# Altium footprint library IC.Pcblib: 91 footprints (part 1 of 6)
Each footprint in its own frame and in the unit in brackets; x right, y up, seen from the top. Pads: shape width x height; smd on the part's side, far side on the other; paste and mask are expansions set on the pad; w line width, h text height; cw(c..) or ccw(c..) is an arc to the next point about the centre after c.
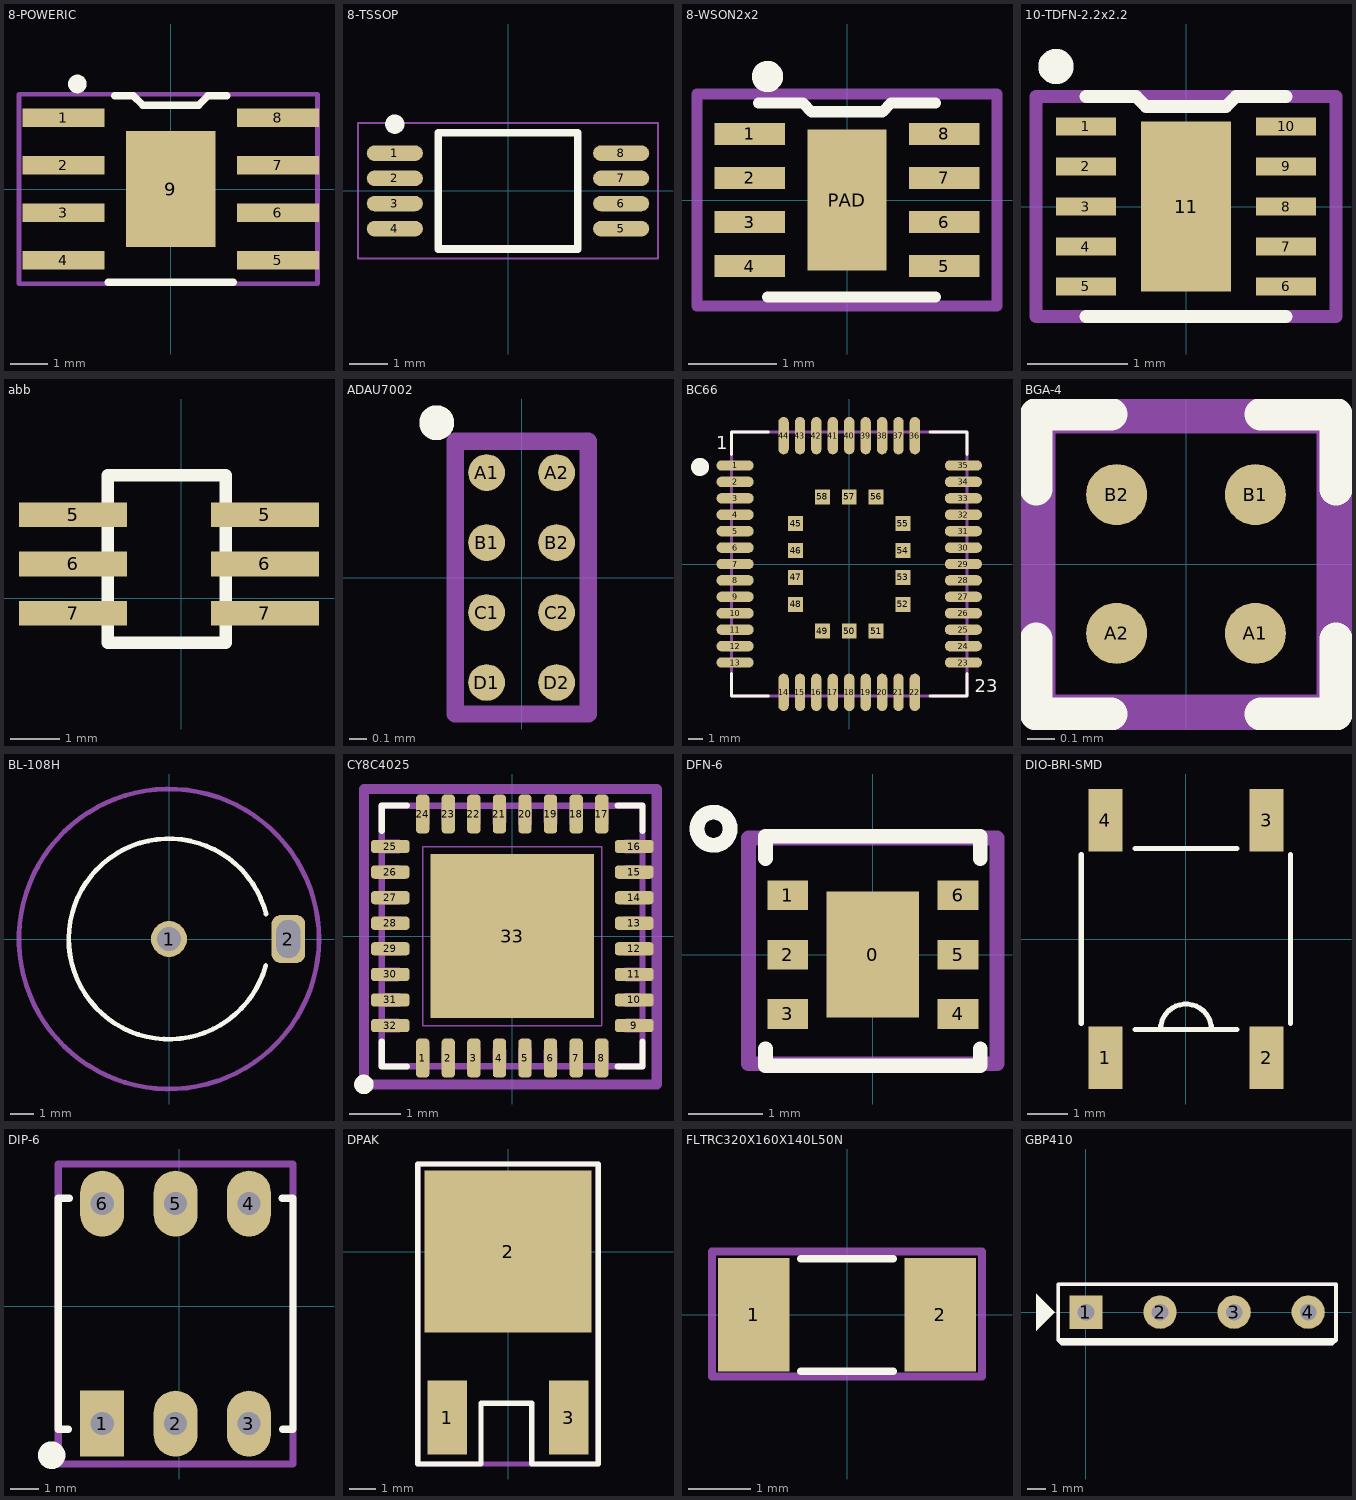
[diagram p0: the footprints below, top view; thin cyan lines are the x and y axes]

## 8-POWERIC [mm] "8-PowerSOIC (0.154\", 3.90mm Width)"
height 1.44
pads (9):
  rect 2.2x0.5 smd: 1(-2.875,1.905) 2(-2.875,0.635) 3(-2.875,-0.635) 4(-2.875,-1.905) 5(2.875,-1.905) 6(2.875,-0.635) 7(2.875,0.635) 8(2.875,1.905)
  rect 2.4x3.1 smd: 9(0,0)
Top Overlay:
  circle w0.25: c-2.5,2.815 r0.125
  lines w0.2: -1.675,-2.5 1.675,-2.5 ; -1.5,2.5 -1,2.5 -0.75,2.25 0.75,2.25 1,2.5 1.5,2.5
Mechanical 13:
  lines w0.127: -4.064,-2.54 3.937,-2.54 3.937,2.54 -4.064,2.54 -4.064,-2.54
  text ".Designator" at -0.127,2.286 h1
Mechanical 15:
  lines w0.127: -4.064,-2.54 -4.064,2.54 3.937,2.54 3.937,-2.54 -4.064,-2.54
  text ".Comment" at -0.127,2.286 h1
3D body "SOIC-81.step": height 1.44, standoff 0, extent -3.015,-2.6 3.015,2.4

## 8-TSSOP [mm] "TSOP, 8-Leads, Body 3.00x4.40mm, Pitch 0.65mm, IPC Medium Density"
height 1.2
pads (8):
  oval 1.45x0.4 smd: 1(-2.925,0.975) 2(-2.925,0.325) 3(-2.925,-0.325) 4(-2.925,-0.975) 5(2.925,-0.975) 6(2.925,-0.325) 7(2.925,0.325) 8(2.925,0.975)
Top Overlay:
  circle w0.25: c-2.925,1.725 r0.125
  lines w0.2: -1.8,-1.5 -1.8,1.5 1.8,1.5 1.8,-1.5 -1.8,-1.5
Mechanical 13:
  text ".Designator" at -1.106,-0.278 h1.5
Mechanical 15:
  lines w0.05: -3.875,-1.75 -3.875,1.75 3.875,1.75 3.875,-1.75 -3.875,-1.75
  text ".Comment" at -1.106,-0.278 h1.5
3D body "TSOP65P640X120-8N.step": height 1.2, standoff 0, extent -3.2,-1.5 3.2,1.5

## 8-WSON2x2 [mm]
pads (9):
  rect 0.8x0.25 smd: 1(-1.1,0.75) 2(-1.1,0.25) 3(-1.1,-0.25) 4(-1.1,-0.75) 5(1.1,-0.75) 6(1.1,-0.25) 7(1.1,0.25) 8(1.1,0.75)
  rect 0.9x1.6 smd: PAD(0,0)
Top Overlay:
  circle w0.254: c-0.9,1.4 r0.05
  lines w0.127: -1,1.1 -0.5,1.1 -0.4,1 0,1 0.4,1 0.5,1.1 1,1.1 ; -0.9,-1.1 1,-1.1
Mechanical 13:
  lines w0.127: -1.7,-1.2 1.7,-1.2 1.7,1.2 -1.7,1.2 -1.7,-1.2
  text ".Designator" at -0.533,-0.152 h0.5
Mechanical 15:
  lines w0.127: -1.7,-1.2 -1.7,1.2 1.7,1.2 1.7,-1.2 -1.7,-1.2
  text ".Comment" at -0.533,-0.152 h0.5
3D body "DSG_8.stp": height 0.81, standoff 0, extent -1.054,-1.054 1.054,1.054

## 10-TDFN-2.2x2.2 [mm]
pads (11):
  rect 0.6x0.18 smd: 1(-1,0.8) 2(-1,0.4) 3(-1,0) 4(-1,-0.4) 5(-1,-0.8) 6(1,-0.8) 7(1,-0.4) 8(1,0) 9(1,0.4) 10(1,0.8)
  rect 0.9x1.7 smd: 11(0,0)
Top Overlay:
  circle w0.254: c-1.3,1.4 r0.05
  lines w0.127: -1,-1.1 1,-1.1 ; -1,1.1 -0.5,1.1 -0.4,1 0,1 0.4,1 0.5,1.1 1,1.1
Mechanical 13:
  lines w0.127: -1.5,-1.1 -1.5,1.1 1.5,1.1 1.5,-1.1 -1.5,-1.1
  text ".Designator" at -0.033,-0.052 h0.5
Mechanical 15:
  lines w0.127: -1.5,-1.1 1.5,-1.1 1.5,1.1 -1.5,1.1 -1.5,-1.1
  text ".Comment" at -0.033,-0.052 h0.5
3D body "DSQ10_1P5X0P9.stp": height 0.8, standoff 0, extent -1.05,-1.05 1.05,1.05

## abb [mm] "U?"
pads (6):
  rect 2.2x0.5 smd: 5(-2.2,1.7) 5(1.7,1.7) 6(-2.2,0.7) 6(1.7,0.7) 7(-2.2,-0.3) 7(1.7,-0.3)
Top Overlay:
  lines w0.254: 0.1,2.5 0.9,2.5 ; 0.9,2.5 -1.5,2.5 -1.5,-0.9 0.9,-0.9 0.9,2.4 0.9,2.5

## ADAU7002 [mm] "BGA, 8-Leads, Body 0.76x1.56mmx0.56mm, Pitch 0.40mm"
height 0.56
pads (8):
  round 0.21 smd: A1(-0.2,0.6) A2(0.2,0.6) B1(-0.2,0.2) B2(0.2,0.2) C1(-0.2,-0.2) C2(0.2,-0.2) D1(-0.2,-0.6) D2(0.2,-0.6)
Top Overlay:
  circle w0.1: c-0.485,0.885 r0.05
Mechanical 13:
  lines w0.1: -0.38,-0.78 0.38,-0.78 0.38,0.78 -0.38,0.78 -0.38,-0.78
3D body "BGA8C40P2X4_76X156X56.step": height 0.56, standoff 0, extent -0.38,-0.78 0.38,0.78

## BC66 [mm]
pads (58):
  oval 2.5x0.7 smd: 1(-7.65,6.6) 2(-7.65,5.5) 3(-7.65,4.4) 4(-7.65,3.3) 5(-7.65,2.2) 6(-7.65,1.1) 7(-7.65,0) 8(-7.65,-1.1) 9(-7.65,-2.2) 10(-7.65,-3.3) 11(-7.65,-4.4) 12(-7.65,-5.5) 13(-7.65,-6.6) 23(7.65,-6.6) 24(7.65,-5.5) 25(7.65,-4.4) 26(7.65,-3.3) 27(7.65,-2.2) 28(7.65,-1.1) 29(7.65,0) 30(7.65,1.1) 31(7.65,2.2) 32(7.65,3.3) 33(7.65,4.4) 34(7.65,5.5) 35(7.65,6.6)
  oval 0.7x2.5 smd: 14(-4.4,-8.6) 15(-3.3,-8.6) 16(-2.2,-8.6) 17(-1.1,-8.6) 18(0,-8.6) 19(1.1,-8.6) 20(2.2,-8.6) 21(3.3,-8.6) 22(4.4,-8.6) 36(4.4,8.6) 37(3.3,8.6) 38(2.2,8.6) 39(1.1,8.6) 40(0,8.6) 41(-1.1,8.6) 42(-2.2,8.6) 43(-3.3,8.6) 44(-4.4,8.6)
  rect 1x1 smd: 45(-3.6,2.7) 46(-3.6,0.9) 47(-3.6,-0.9) 48(-3.6,-2.7) 49(-1.8,-4.5) 50(0,-4.5) 51(1.8,-4.5) 52(3.6,-2.7) 53(3.6,-0.9) 54(3.6,0.9) 55(3.6,2.7) 56(1.8,4.5) 57(0,4.5) 58(-1.8,4.5)
Top Overlay:
  circle w0.8: c-10,6.5 r0.2
  lines w0.2: -7.9,-8.85 -5.4,-8.85 ; -7.9,-8.85 -7.9,-7.35 ; -7.9,7.35 -7.9,8.85 -5.4,8.85 ; 5.4,-8.85 7.9,-8.85 ; 5.4,8.85 7.9,8.85 7.9,7.35 ; 7.9,-8.85 7.9,-7.35
  text "1" at -8.9,7.4 h1.5
  text "23" at 8.4,-8.9 h1.5
Mechanical 13:
  lines w0.2: -7.9,-8.85 7.9,-8.85 7.9,8.85 -7.9,8.85 -7.9,-8.85
  text ".Designator" at -2.1,-0.8 h1.5
Mechanical 15:
  lines w0.2: -7.9,-8.85 -7.9,8.85 7.9,8.85 7.9,-8.85 -7.9,-8.85
  text ".Comment" at -2.1,-0.5 h1.5

## BGA-4 [mm] "Ball Grid Array (BGA), 0.50 mm pitch, square; 4 pin, 0.888 mm L X 0.888 mm W X 0.50 mm H body"
height 0.5
pads (4):
  round 0.22 smd: A1(0.25,-0.25) A2(-0.25,-0.25) B1(0.25,0.25) B2(-0.25,0.25)
Top Overlay:
  lines w0.12: -0.54,-0.27 -0.54,-0.54 -0.27,-0.54 ; -0.54,0.27 -0.54,0.54 -0.27,0.54 ; 0.27,-0.54 0.54,-0.54 0.54,-0.27 ; 0.27,0.54 0.54,0.54 0.54,0.27
Mechanical 13:
  lines w0.127: -0.533,-0.533 -0.533,0.533 0.533,0.533 0.533,-0.533 -0.533,-0.533
  text ".Designator" at -0.533,-0.152 h0.5
Mechanical 15:
  lines w0.127: -0.533,-0.533 -0.533,0.533 0.533,0.533 0.533,-0.533 -0.533,-0.533
  text ".Comment" at -0.533,-0.152 h0.5
3D body "BGA4CP50_2X2_88X88X50B22.STEP": height 0.5, standoff 0, extent -0.444,-0.444 0.444,0.444

## BL-108H [mm]
pads (2):
  round 1.5 hole 1: 1(0,0)
  rrect50% 1.4x2 hole 1.6 slot 1 at 0 deg: 2(5,0)
Top Overlay:
  lines w0.2: 4.05,-1.114 cw(c0,0) 4.067,1.049
Mechanical 13:
  circle w0.2: c0,0 r6.283
  text ".Designator" at -3.658,-0.74 h2
3D body: height 8, standoff 0, extent -4.2,-4.2 4.2,4.2

## CY8C4025 [mm]
pads (33):
  rrect54% 0.26x0.76 smd: 1(-1.75,-2.385) 2(-1.25,-2.385) 3(-0.75,-2.385) 4(-0.25,-2.385) 5(0.25,-2.385) 6(0.75,-2.385) 7(1.25,-2.385) 8(1.75,-2.385) 17(1.75,2.385) 18(1.25,2.385) 19(0.75,2.385) 20(0.25,2.385) 21(-0.25,2.385) 22(-0.75,2.385) 23(-1.25,2.385) 24(-1.75,2.385)
  rrect54% 0.76x0.26 smd: 9(2.385,-1.75) 10(2.385,-1.25) 11(2.385,-0.75) 12(2.385,-0.25) 13(2.385,0.25) 14(2.385,0.75) 15(2.385,1.25) 16(2.385,1.75) 25(-2.385,1.75) 26(-2.385,1.25) 27(-2.385,0.75) 28(-2.385,0.25) 29(-2.385,-0.25) 30(-2.385,-0.75) 31(-2.385,-1.25) 32(-2.385,-1.75)
  rect 3.2x3.2 smd paste-3.5: 33(0,0)
Top Overlay:
  circle w0.2: c-2.9,-2.9 r0.09
  lines w0.12: -2.55,-2.06 -2.55,-2.55 -2.06,-2.55 ; -2.55,2.06 -2.55,2.55 -2.06,2.55 ; 2.06,-2.55 2.55,-2.55 2.55,-2.06 ; 2.06,2.55 2.55,2.55 2.55,2.06
Top Paste:
  region: 1.495,-1.495 0.255,-1.495 0.255,-0.255 1.495,-0.255
  region: 1.495,0.255 0.255,0.255 0.255,1.495 1.495,1.495
  region: -0.255,-1.495 -1.495,-1.495 -1.495,-0.255 -0.255,-0.255
  region: -0.255,0.255 -1.495,0.255 -1.495,1.495 -0.255,1.495
Mechanical 11:
  lines w0.12: -2.55,-2.55 -2.55,2.55 2.55,2.55 2.55,-2.55 -2.55,-2.55
Mechanical 12:
  lines w0.025: -2.5,-2.5 -2.5,2.5 2.5,2.5 2.5,-2.5 -2.5,-2.5 ; -2.5,-1.87 -2.22,-1.87 ccw(c-2.22,-1.75) -2.22,-1.63 -2.5,-1.63 -2.5,-1.87 ; -2.5,-1.37 -2.22,-1.37 ccw(c-2.22,-1.25) -2.22,-1.13 -2.5,-1.13 -2.5,-1.37 ; -2.5,-0.87 -2.22,-0.87 ccw(c-2.22,-0.75) -2.22,-0.63 -2.5,-0.63 -2.5,-0.87 ; -2.5,-0.37 -2.22,-0.37 ccw(c-2.22,-0.25) -2.22,-0.13 -2.5,-0.13 -2.5,-0.37 ; -2.5,0.13 -2.22,0.13 ccw(c-2.22,0.25) -2.22,0.37 -2.5,0.37 -2.5,0.13 ; -2.5,0.63 -2.22,0.63 ccw(c-2.22,0.75) -2.22,0.87 -2.5,0.87 -2.5,0.63 ; -2.5,1.13 -2.22,1.13 ccw(c-2.22,1.25) -2.22,1.37 -2.5,1.37 -2.5,1.13 ; -2.5,1.63 -2.22,1.63 ccw(c-2.22,1.75) -2.22,1.87 -2.5,1.87 -2.5,1.63 ; -1.87,-2.5 -1.87,-2.22 cw(c-1.75,-2.22) -1.63,-2.22 -1.63,-2.5 -1.87,-2.5 ; -1.87,2.22 ccw(c-1.75,2.22) -1.63,2.22 -1.63,2.5 -1.87,2.5 -1.87,2.22 ; -1.75,-1.75 1.75,-1.75 1.75,1.75 -1.75,1.75 -1.75,-1.75 ; -1.37,-2.5 -1.37,-2.22 cw(c-1.25,-2.22) -1.13,-2.22 -1.13,-2.5 -1.37,-2.5 ; -1.37,2.22 ccw(c-1.25,2.22) -1.13,2.22 -1.13,2.5 -1.37,2.5 -1.37,2.22 ; -0.87,-2.5 -0.87,-2.22 cw(c-0.75,-2.22) -0.63,-2.22 -0.63,-2.5 -0.87,-2.5 ; -0.87,2.22 ccw(c-0.75,2.22) -0.63,2.22 -0.63,2.5 -0.87,2.5 -0.87,2.22 ; -0.37,-2.5 -0.37,-2.22 cw(c-0.25,-2.22) -0.13,-2.22 -0.13,-2.5 -0.37,-2.5 ; -0.37,2.22 ccw(c-0.25,2.22) -0.13,2.22 -0.13,2.5 -0.37,2.5 -0.37,2.22 ; 0.13,-2.5 0.13,-2.22 cw(c0.25,-2.22) 0.37,-2.22 0.37,-2.5 0.13,-2.5 ; 0.13,2.22 ccw(c0.25,2.22) 0.37,2.22 0.37,2.5 0.13,2.5 0.13,2.22 ; 0.63,-2.5 0.63,-2.22 cw(c0.75,-2.22) 0.87,-2.22 0.87,-2.5 0.63,-2.5 ; 0.63,2.22 ccw(c0.75,2.22) 0.87,2.22 0.87,2.5 0.63,2.5 0.63,2.22 ; 1.13,-2.5 1.13,-2.22 cw(c1.25,-2.22) 1.37,-2.22 1.37,-2.5 1.13,-2.5 ; 1.13,2.22 ccw(c1.25,2.22) 1.37,2.22 1.37,2.5 1.13,2.5 1.13,2.22 ; 1.63,-2.5 1.63,-2.22 cw(c1.75,-2.22) 1.87,-2.22 1.87,-2.5 1.63,-2.5 ; 1.63,2.22 ccw(c1.75,2.22) 1.87,2.22 1.87,2.5 1.63,2.5 1.63,2.22 ; 2.22,-1.87 cw(c2.22,-1.75) 2.22,-1.63 2.5,-1.63 2.5,-1.87 2.22,-1.87 ; 2.22,-1.37 cw(c2.22,-1.25) 2.22,-1.13 2.5,-1.13 2.5,-1.37 2.22,-1.37 ; 2.22,-0.87 cw(c2.22,-0.75) 2.22,-0.63 2.5,-0.63 2.5,-0.87 2.22,-0.87 ; 2.22,-0.37 cw(c2.22,-0.25) 2.22,-0.13 2.5,-0.13 2.5,-0.37 2.22,-0.37 ; 2.22,0.13 cw(c2.22,0.25) 2.22,0.37 2.5,0.37 2.5,0.13 2.22,0.13 ; 2.22,0.63 cw(c2.22,0.75) 2.22,0.87 2.5,0.87 2.5,0.63 2.22,0.63 ; 2.22,1.13 cw(c2.22,1.25) 2.22,1.37 2.5,1.37 2.5,1.13 2.22,1.13 ; 2.22,1.63 cw(c2.22,1.75) 2.22,1.87 2.5,1.87 2.5,1.63 2.22,1.63
Mechanical 13:
  lines w0.2: -2.9,-2.9 -2.9,2.875 2.825,2.875 2.825,-2.9 -2.9,-2.9
  text ".Designator" at -1.75,-0.75 h1.5
3D body "User Library-QFN32-1.STEP": height 0.9, standoff -0.03, extent -2.5,-2.5 2.5,2.5

## DFN-6 [mm] "SON, 8-Leads, Body 2x3mm, Pitch 0.5mm, Microchip Recommended"
height 1
pads (7):
  rect 1.25x1.7 smd: 0(0,0)
  rect 0.55x0.4 smd: 1(-1.15,0.8) 2(-1.15,0) 3(-1.15,-0.8) 4(1.15,-0.8) 5(1.15,0) 6(1.15,0.8)
Top Overlay:
  circle w0.2: c-2.15,1.7 r0.224
  lines w0.2: -1.45,-1.27 -1.45,-1.5 1.45,-1.5 1.45,-1.27 ; -1.45,1.3 -1.45,1.6 1.45,1.6 1.45,1.3
Mechanical 13:
  lines w0.2: -1.676,-1.473 -1.676,1.575 1.676,1.575 1.676,-1.473 -1.676,-1.473
Mechanical 15:
  lines w0.2: -1.676,-1.473 1.676,-1.473 1.676,1.575 -1.676,1.575 -1.676,-1.473
3D body "GAS_CD_SGP40_STEP_File.step": height 0.85, standoff 0, extent -1.221,-1.221 1.221,1.221

## DIO-BRI-SMD [mm]
pads (4):
  rect 0.85x1.55 smd: 1(-2,-2.95) 2(2,-2.95) 3(2,2.95) 4(-2,2.95)
Top Overlay:
  lines w0.127: -2.6,-2.1 -2.6,2.1 ; -1.27,-2.25 1.27,-2.25 ; -1.27,2.25 1.27,2.25 ; -0.635,-2.25 cw(c0,-2.25) 0.635,-2.25 ; 2.6,-2.1 2.6,2.1
3D body: height 1.5, standoff 0, extent -2.4,-2.105 2.4,2.105

## DIP-6 [mil]
height 100
pads (6):
  rect 60x90 hole 31.5: 1(-105,-160)
  oval 60x90 hole 31.5: 2(-5,-160) 3(95,-160) 4(95,140) 5(-5,140) 6(-105,140)
Top Overlay:
  circle w19.68: c-174,-203 r8.94
  lines w10: -150.99,-167.48 -165,-167.48 -165,147.48 -150,147.48 ; 140,147.48 155,147.48 155,-167.48 140.99,-167.48
Mechanical 13:
  lines w10: -165,-215 -165,194 155,194 155,-215 -165,-215
  text ".Desigantor" at 14.13,-105 h78.74
3D body "SW3DPS-DIP6-DEFAULT.STEP": height 169.69, standoff -129.13, extent -163.11,-167.48 155,147.48

## DPAK [mm]
pads (3):
  rect 1.5x2.8 smd: 1(-2.286,-6.25) 3(2.286,-6.25)
  rect 6.3x6.1 smd: 2(0,0)
Top Overlay:
  lines w0.2: -3.4,-8 -3.4,3.3 3.4,3.3 3.4,-8 0.889,-8 0.889,-5.715 -1.016,-5.715 -1.016,-8 -3.4,-8
Mechanical 13:
  lines w0.2: -3.4,-8 -3.4,3.3 3.4,3.3 3.4,-8 -3.4,-8
  text ".Designator" at -0.6,1.5 h1.5
Mechanical 15:
  lines w0.2: -3.4,-8 3.4,-8 3.4,3.3 -3.4,3.3 -3.4,-8
  text ".Comment" at -0.3,1.5 h1.5
3D body "User Library-DPAK-1.step": height 2.44, standoff 0.03, extent -3.238,-7.001 3.302,2.937

## FLTRC320X160X140L50N [mm] "Filter, Chip; 3.20 mm L X 1.60 mm W X 1.40 mm H body"
height 1.4
pads (2):
  rect 1.14x1.82 smd: 1(-1.49,0) 2(1.49,0)
Top Overlay:
  lines w0.12: -0.74,-0.9 0.74,-0.9 ; -0.74,0.9 0.74,0.9
Mechanical 13:
  lines w0.127: -2.159,-0.991 -2.159,1.016 2.159,1.016 2.159,-0.991 -2.159,-0.991
  text ".Designator" at -1.88,-0.254 h1
Mechanical 15:
  lines w0.127: -2.159,-0.991 -2.159,1.016 2.159,1.016 2.159,-0.991 -2.159,-0.991
  text ".Comment" at -1.981,-0.305 h1
3D body "FLTRC320X160X140L50.STEP": height 1.4, standoff 0, extent -1.6,-0.8 1.6,0.8

## GBP410 [mm]
pads (4):
  rect 1.8x1.8 hole 0.9: 1(0,0)
  round 1.8 hole 0.9: 2(4,0) 3(8,0) 4(12,0)
Top Overlay:
  region: -2.7,-1 -1.7,0 -2.7,1
  lines w0.2: -1.5,-1.5 -1.3,-1.7 13.3,-1.7 13.5,-1.5 ; -1.5,-1.5 13.5,-1.5 ; -1.5,-1.5 -1.5,1.5 13.5,1.5 13.5,-1.5
Mechanical 13:
  lines w0.2: -1.5,-1.5 13.5,-1.5 ; -1.5,-1.5 -1.5,1.5 13.5,1.5 13.5,-1.5 ; -1.5,-1.5 -1.3,-1.7 13.3,-1.7 13.5,-1.5
  text ".Designator" at 4.797,-0.227 h1
Mechanical 15:
  lines w0.2: -1.5,-1.5 13.5,-1.5 ; -1.5,-1.5 -1.5,1.5 13.5,1.5 13.5,-1.5 ; -1.5,-1.5 -1.3,-1.7 13.3,-1.7 13.5,-1.5
  text ".Comment" at 5.051,-0.227 h1